# Altium integrated library CoLib.IntLib: 649 symbols (part 5 of 5)
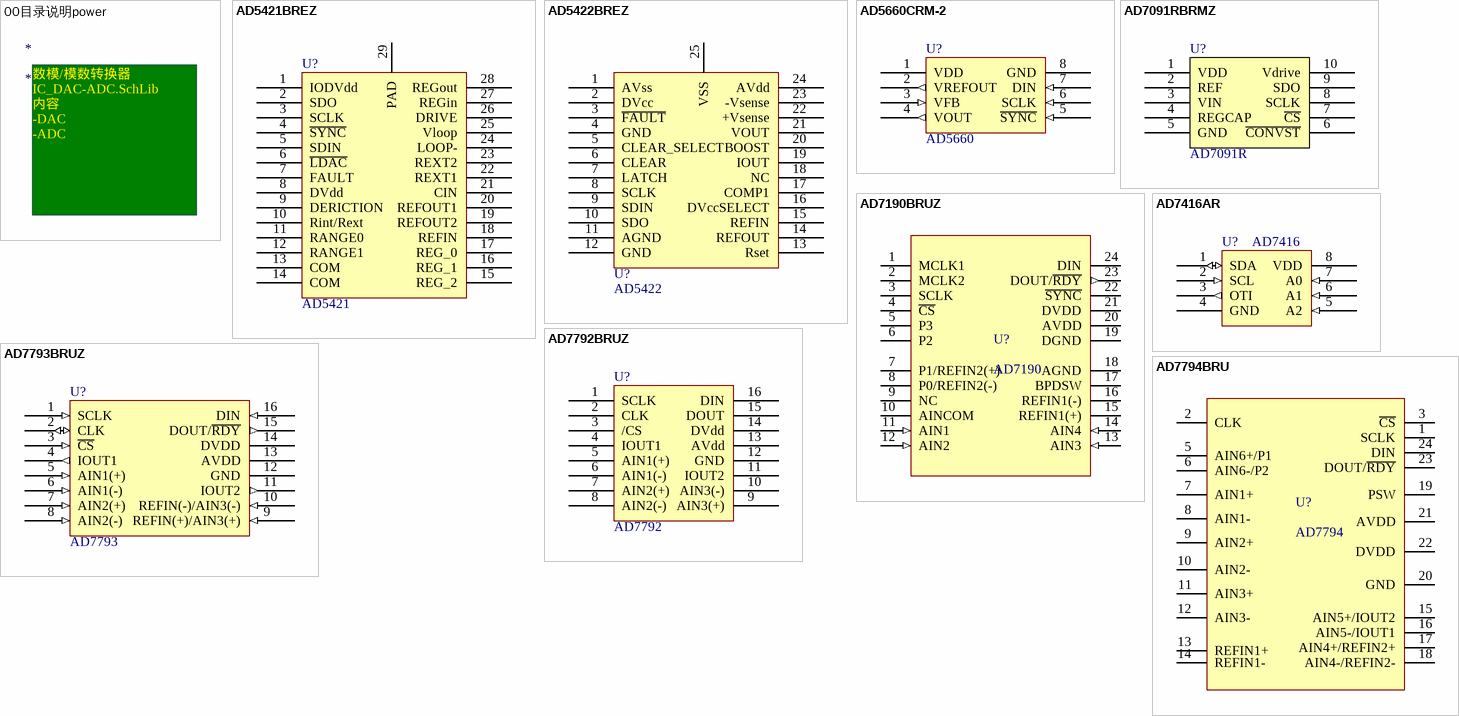
[diagram p43: symbols 00目录说明power to AD7794BRU]

## AD7794BRU
designator U?, comment AD7794
6-Channel, Low Noise, Low Power, 24 Bit Σ-Δ ADCwith On-Chip In-Amp and Reference; Manufacturer: ADI; Name: 模数转换器; Ordering No.: AD7794BRU
footprint TSSOP24/0.65_7.8*4.4 (TSSOP, 24-Leads, Body 7.9x4.5mm (max), Pitch 0.65mm, IPC Medium Density)
pins: 1 SCLK, 2 CLK, 3 ~{CS}, 5 AIN6+/P1, 6 AIN6-/P2, 7 AIN1+, 8 AIN1-, 9 AIN2+, 10 AIN2-, 11 AIN3+, 12 AIN3-, 13 REFIN1+, 14 REFIN1-, 15 AIN5+/IOUT2, 16 AIN5-/IOUT1, 17 AIN4+/REFIN2+, 18 AIN4-/REFIN2-, 19 PSW, 20 GND, 21 AVDD, 22 DVDD, 23 DOUT/~{RDY}, 24 DIN


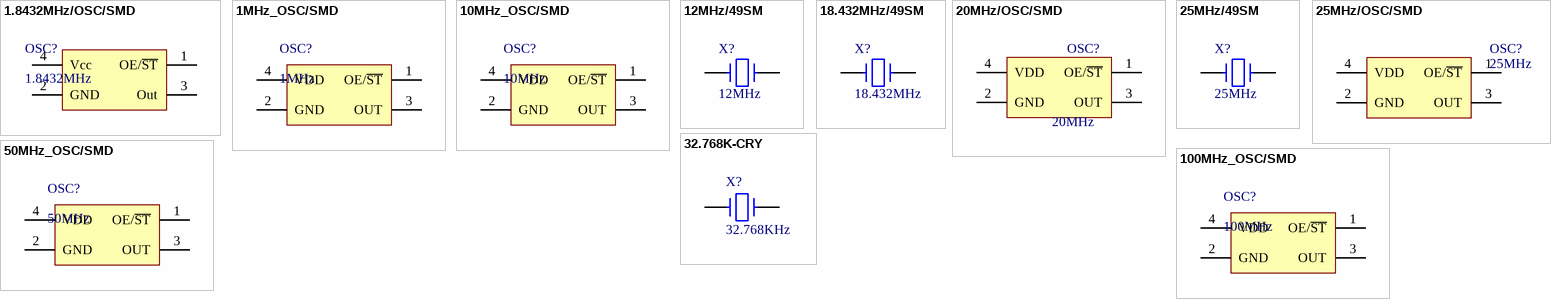
[diagram p35: symbols 1.8432MHz/OSC/SMD to 100MHz_OSC/SMD]

## 1.8432MHz/OSC/SMD
designator OSC?, comment 1.8432MHz
有源晶振,1.8432MHz, 30ppm,supply voltage:3.3V, dimension:7*5mm; Manufacturer: TAITIEN; Ordering No.: OCEMELKANF-1.843200; Name: 晶振; dimension: 7.0*5.0mm
footprint OSC7050 (晶振SMD 7.0x5.0mm)
pins: 1 OE/~{ST}, 2 GND, 3 Out, 4 Vcc

## 1MHz_OSC/SMD
designator OSC?, comment 1MHz
有源晶振,1MHz, 7x5mm; Manufacturer: Epson; 物料型号说明: 表贴7x5mm; Ordering NO.: SG8002CAPCB1MHZ; 物料替代型号: KDS,Citizen,SEIKO同型; Name: 晶振; 物料参考价格: 3.01
footprint OSC7050 (晶振SMD 7.0x5.0mm)
pins: 1 OE/~{ST}, 2 GND, 3 OUT, 4 VDD

## 10MHz_OSC/SMD
designator OSC?, comment 10MHz
有源晶振,10MHz, 7x5mm; Manufacturer: Epson; Ordering NO.: SG8002CAPCB10MHZ; 物料替代型号: KDS,Citizen,SEIKO同型; Name: 晶振
footprint OSC7050 (晶振SMD 7.0x5.0mm)
pins: 1 OE/~{ST}, 2 GND, 3 OUT, 4 VDD

## 12MHz/49SM
designator X?, comment 12MHz
通用石英晶体,12MHz,49SM; Manufacturer: KDS; 物料参考价格: 0.8; 物料型号说明: 49SM表贴晶体; Ordering NO.: 12MHz/49SM; Name: 晶体; 物料替代型号: n/a
footprint CRY13*4.8 (贴片晶振,13*4.8*4.3mm)
pins: 1, 2

## 18.432MHz/49SM
designator X?, comment 18.432MHz
通用石英晶体,18.432MHz,49SM; Manufacturer: TAITIEN; Name: 晶体; Ordering NO.: XJHEEL-18.432MHz
footprint CRY13*4.8 (贴片晶振,13*4.8*4.3mm)
pins: 1, 2

## 20MHz/OSC/SMD
designator OSC?, comment 20MHz
有源晶振,20MHz, 30ppm,supply voltage:3.3V, dimension:7*5mm; Manufacturer: TAITIEN; Ordering NO.: OCEMELJANF-20.000000; Name: 晶振
footprint OSC7050 (晶振SMD 7.0x5.0mm)
pins: 1 OE/~{ST}, 2 GND, 3 OUT, 4 VDD

## 25MHz/49SM
designator X?, comment 25MHz
通用石英晶体25MHz,49SM; Manufacturer: KDS; 物料参考价格: 0.8; 物料型号说明: 49SM表贴晶体; Ordering NO.: 25MHz/49SM; Name: 晶体; 物料替代型号: n/a
footprint CRY13*4.8 (贴片晶振,13*4.8*4.3mm)
pins: 1, 2

## 25MHz/OSC/SMD
designator OSC?, comment 25MHz
有源晶振,25MHz, 7x5mm; Name: 晶振; Price: 3.01; Ordering NO.: 25MHz
footprint OSC7050 (晶振SMD 7.0x5.0mm)
pins: 1 OE/~{ST}, 2 GND, 3 OUT, 4 VDD

## 32.768K-CRY
designator X?, comment 32.768KHz
晶体,32.768KHz,50ppm,12.5pF; Manufacturer: 泰艺; Name: 晶体; Ordering NO.: 32.768K
footprint CRY-32K (Footprint not found)
pins: 1, 2

## 50MHz_OSC/SMD
designator OSC?, comment 50MHz
有源晶振,50MHz, 7x5mm; Manufacturer: Epson; 物料型号说明: 表贴7x5mm; Ordering NO.: SG8002CAPCB50MHZ; 物料替代型号: KDS,Citizen,SEIKO同型; Name: 晶振; 物料参考价格: 3.01
footprint OSC7050 (晶振SMD 7.0x5.0mm)
pins: 1 OE/~{ST}, 2 GND, 3 OUT, 4 VDD

## 100MHz_OSC/SMD
designator OSC?, comment 100MHz
有源晶振,100MHz, 7x5mm; Manufacturer: Epson; 物料型号说明: 表贴7x5mm; Ordering NO.: SG8002CAPCB100MHZ; 物料替代型号: KDS,Citizen,SEIKO同型; Name: 晶振; 物料参考价格: 3.01
footprint OSC7050 (晶振SMD 7.0x5.0mm)
pins: 1 OE/~{ST}, 2 GND, 3 OUT, 4 VDD


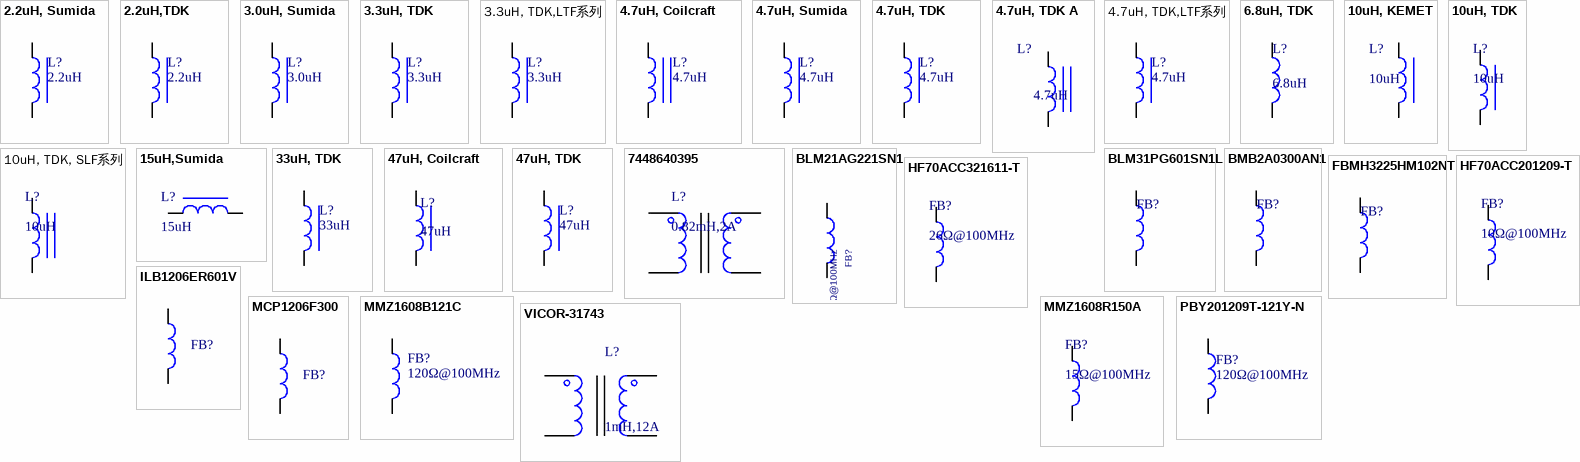
[diagram p36: symbols 2.2uH, Sumida to VICOR-31743]

## 2.2uH, Sumida
designator L?, comment 2.2uH
功率电感, 2.2uH, 31.3mΩ, 2.04A, 30%,5x5mm; Manufacturer: sumida; Ordering NO.: CDRH4D28NP-2R2NC; Name: 电感
footprint L5*5 (Footprint not found)
pins: 1, 2

## 2.2uH,TDK
designator L?, comment 2.2uH
功率电感, 2.2uH, 0.076Ω, 1.5A, 20%,3.5x3.7mm; Manufacturer: TDK; Ordering NO.: VLF4012AT-2R2M1R5; Name: 电感; Price: 1.5
footprint L3.5*3.7 (磁罐电感3.5*3.7mm厚1.2mm表贴电感)
pins: 1, 2

## 3.0uH, Sumida
designator L?, comment 3.0uH
功率电感, 3.0uH, 24mΩ, 2.4A, 30%,6x6mm(MAX); Manufacturer: sumida; Ordering NO.: CDRH5D28NP-3R0NC; Name: 电感
footprint L6*6 (Footprint not found)
pins: 1, 2

## 3.3uH, TDK
designator L?, comment 3.3uH
功率电感, 3.3uH, 0.1Ω, 1.3A, 20%,3.5x3.7mm; Manufacturer: TDK; Ordering NO.: VLF4012AT-3R3M1R3; Tips: 1A型%20,3.5x3.7mm; Name: 电感; Price: 1.5; 物料替代型号: n/a
footprint L3.5*3.7 (磁罐电感3.5*3.7mm厚1.2mm表贴电感)
pins: 1, 2

## 3.3uH, TDK,LTF系列
designator L?, comment 3.3uH
功率电感, 3.3uH, 0.1Ω, 1.3A, 20%,3.5x3.7mm; Manufacturer: TDK; Ordering NO.: LTF5022T-3R3N2R5-LC; Name: 电感
footprint L5.0*5.2 (Footprint not found)
pins: 1, 2

## 4.7uH, Coilcraft
designator L?, comment 4.7uH
功率电感, 4.7uH, 43mΩ, 方形罐装6.1 × 6.1 mm; Manufacturer: Coilcraft; Ordering NO.: MSS6132-472ML; Name: 电感
footprint L6.1*6.1 (Footprint not found)
pins: 1, 2

## 4.7uH, Sumida
designator L?, comment 4.7uH
功率电感, 4.7uH, 72mΩ, 1.32A, 30%,5x5mm; Manufacturer: sumida; Ordering NO.: CDRH4D28NP-4R7NC; Name: 电感
footprint L5*5 (Footprint not found)
pins: 1, 2

## 4.7uH, TDK
designator L?, comment 4.7uH
功率电感, 4.7uH, 0.14Ω, 1.1A, 3.5x3.7mm; Manufacturer: TDK; Ordering NO.: VLF4012AT-4R7M1R1; Tips: 1A型%20,3.5x3.7mm; Name: 电感; Price: 1.5; 物料替代型号: n/a
footprint L3.5*3.7 (磁罐电感3.5*3.7mm厚1.2mm表贴电感)
pins: 1, 2

## 4.7uH, TDK A
designator L?, comment 4.7uH
功率电感, 4.7uH, 方形罐装 7.1mm × 6.1 mm; Manufacturer: TDK; Ordering NO.: SPM6530T4R7M230; Name: 电感
footprint L 7.1*6.5
pins: 1, 2

## 4.7uH, TDK,LTF系列
designator L?, comment 4.7uH
功率电感, 4.7uH, 0.14Ω, 1.1A, 3.5x3.7mm; Manufacturer: TDK; Ordering NO.: LTF5022T-4R7N2R0-LC; Name: 电感
footprint L5.0*5.2 (Footprint not found)
pins: 1, 2

## 6.8uH, TDK
designator L?, comment 6.8uH
Manufacturer: muRata; Ordering NO.: LQM31PN4R7M00; Name: 电感
footprint L1206 (贴片磁珠1206, 120 x 60 mil)
pins: 1, 2

## 10uH, KEMET
designator L?, comment 10uH
片式电感, 10uH, ±20%, 1.2Ω, 0.24A, 0805; Manufacturer: KEMET; Ordering NO.: L0805C100MDWIT; Tips: 10uH电源用电感; Name: 电感
footprint L0805 (贴片电感或磁珠0805,80 x 50mil)
pins: 1, 2

## 10uH, TDK
designator L?, comment 10uH
功率电感, 10uH, 1.15Ω, 0.4A; Manufacturer: TDK; Ordering NO.: VLS201610ET-100M; Name: 电感
footprint L0806 (2mmX1.6mm)
pins: 1, 2

## 10uH, TDK, SLF系列
designator L?, comment 10uH
功率电感, 10uH, 0.0364Ω, 2.5A, 10.1mmx10.1mm; Manufacturer: TDK; Ordering NO.: SLF10145T-100M2R5-PF; Name: 电感
footprint L10.1*10.1 (10.1mmX10.1mm)
pins: 1, 2

## 15uH,Sumida
designator L?, comment 15uH
功率电感, 15uH,  41mΩ, 3.4A, 方形罐装, 10.3mm × 10.5mm; Manufacturer: Sumida; Ordering NO.: CDRH105R-150; Name: 电感
footprint L10.3*10.5 (sumida公司功率电感封装)
pins: 1, 2

## 33uH, TDK
designator L?, comment 33uH
功率电感, 33uH, 1.2Ω, 0.44A, 3.5x3.7mm; Manufacturer: TDK; Ordering NO.: VLF4012AT-330MR39; Tips: 1A型%20,3.5x3.7mm; Name: 电感; Price: 1.5; 物料替代型号: n/a
footprint L3.5*3.7 (磁罐电感3.5*3.7mm厚1.2mm表贴电感)
pins: 1, 2

## 47uH, Coilcraft
designator L?, comment 47uH
功率电感, 47uH, 0.1Ω, 1.85A, 方形罐装; Manufacturer: Coilcraft; Ordering NO.: MMS1206-473MXD/B; Name: 电感; Price: 0.21
footprint L0805 (贴片电感或磁珠0805,80 x 50mil)
pins: 1, 2

## 47uH, TDK
designator L?, comment 47uH
功率电感, 47uH, 0.2Ω, 0.36A, 3.5x3.7mm; Manufacturer: TDK; Ordering NO.: VLF4012AT-470MR30; Tips: 1A型%20,3.5x3.7mm; Name: 电感; Price: 1.5; 物料替代型号: n/a
footprint L3.5*3.7 (磁罐电感3.5*3.7mm厚1.2mm表贴电感)
pins: 1, 2

## 7448640395
designator L?, comment 0.82mH,2A
共模电感,0.82mH,2A,Current Compensated Choke; Manufacturer: WE; Ordering No.: 7448640395; Name: 共模电感
footprint INDC-13
pins: 1, 2, 3, 4

## BLM21AG221SN1
designator FB?, comment 220Ω@100MHz
磁珠,IND - SMD EMI Filters/Chip Ferrite Bead, 220Ω(Impedance) @ 100MHz, 0.35Ω (DC Resistance),0805; Manufacturer: Murata; Ordering NO.: BLM21AG221SN1; Item Num: P04-16225R; RoHS Compliant: Yes; Price: 0; Name: 磁珠
footprint L0805 (贴片电感或磁珠0805,80 x 50mil)
pins: 1, 2

## BLM31PG601SN1L
designator FB?, comment 600Ω@100MHz  (value not drawn)
高电流片式电源线磁珠, 600Ω(Impedance)@100MHz,  0.09Ω(DC Resistance), 1.5A, 1206; Manufacturer: Murata; Ordering NO.: BLM31PG601SN1L; Name: 磁珠
footprint L1206 (贴片电感或磁珠1206, 120 x 60 mil)
pins: 1, 2

## BMB2A0300AN1
designator FB?, comment 300Ω@100MHz  (value not drawn)
磁珠, 300Ω(Impedance)@100MHz,  0.5Ω(DC Resistance), 250mA, 0805; Manufacturer: TE; Ordering NO.: BMB2A0300AN1; Tips: 配合AD5422使用; Name: 磁珠
footprint L0805 (贴片电感或磁珠0805,80 x 50mil)
pins: 1, 2

## FBMH3225HM102NT
designator FB?, comment 1000Ω@100MHz  (value not drawn)
高电流片式电源线磁珠, 1000Ω(Impedance)@100MHz,  0.1Ω(DC Resistance), 2A, 1210; Manufacturer: Taiyo Yuden; Ordering NO.: FBMH3225HM102NT; Tips: 配合AD5422使用; Name: 磁珠
footprint L1210 (Footprint not found)
pins: 1, 2

## HF70ACC201209-T
designator FB?, comment 10Ω@100MHz
磁珠, 10Ω(Impedance)@100MHz, 0.03Ω(DC resistance),1.5A, 0805; Manufacturer: TDK; 物料替代型号: HF50ACC201209; Ordering NO.: HF70ACC201209-T; Tips: 电源型26R@100MHz,40mR,1.5A,2000/卷; Price: 0.80; Name: 磁珠
footprint L0805 (贴片电感或磁珠0805,80 x 50mil)
pins: 1, 2

## HF70ACC321611-T
designator FB?, comment 26Ω@100MHz
磁珠, 26Ω(Impedance)@100MHz, 0.04Ω(DC resistance),1.5A, 1206; Manufacturer: TDK; Ordering NO.: HF70ACC321611-T; Tips: 电源型26R@100MHz,40mR,1.5A,; Price: 0.80; 物料替代型号: n/a; Name: 磁珠
footprint L1206 (贴片磁珠1206, 120 x 60 mil)
pins: 1, 2

## ILB1206ER601V
designator FB?, comment 600Ω@100MHz  (value not drawn)
磁珠, 600Ω(Impedance)@100MHz,1206; Manufacturer: VISHAY; Ordering NO.: ILB1206ER601V; Name: 磁珠
footprint L1206 (贴片磁珠1206, 120 x 60 mil)
pins: 1, 2

## MCP1206F300
designator FB?, comment 30Ω@100MHz  (value not drawn)
磁珠, 30Ω(Impedance)@100MHz, 0.02Ω(DC resistance), 4A, 1206; Manufacturer: AEM; Ordering NO.: MCP1206F300; Name: 磁珠
footprint L1206 (Footprint not found)
pins: 1, 2

## MMZ1608B121C
designator FB?, comment 120Ω@100MHz
磁珠, 120Ω(Impedance)@100MHz,0.15Ω(DC resistance), 0.6A,0603; Manufacturer: TDK; Ordering NO.: MMZ1608B121C; Price: 0.21; Name: 磁珠
footprint L0603 (贴边电感0603或磁珠,60 x 30 mil)
pins: 1, 2

## MMZ1608R150A
designator FB?, comment 15Ω@100MHz
磁珠, 15Ω(Impedance)@100MHz, 0.05Ω(DC resistance),1.5A, 0603; Manufacturer: TDK; 物料替代型号: MMZ1608R300A/0603; Ordering NO.: MMZ1608R150A; Tips: 电源型15R@100MHz,50mR,1.5A,2000/卷; Price: 0.80; Name: 磁珠
footprint L0603 (贴边电感0603或磁珠,60 x 30 mil)
pins: 1, 2

## PBY201209T-121Y-N
designator FB?, comment 120Ω@100MHz
磁珠, 120Ω(Impedance)@100MHz, 0.04Ω(DC resistance), 3A, 0805; Manufacturer: YAGEO CORPORATION; Ordering NO.: PBY201209T-121Y-N; Name: 磁珠
footprint L0805
pins: 1, 2

## VICOR-31743
designator L?, comment 1mH,12A
共模电感 1mH 12A; Manufacturer: VICOR; Ordering NO.: VICOR-31743; Name: 共模电感
footprint INDC-15
pins: 1, 2, 3, 4


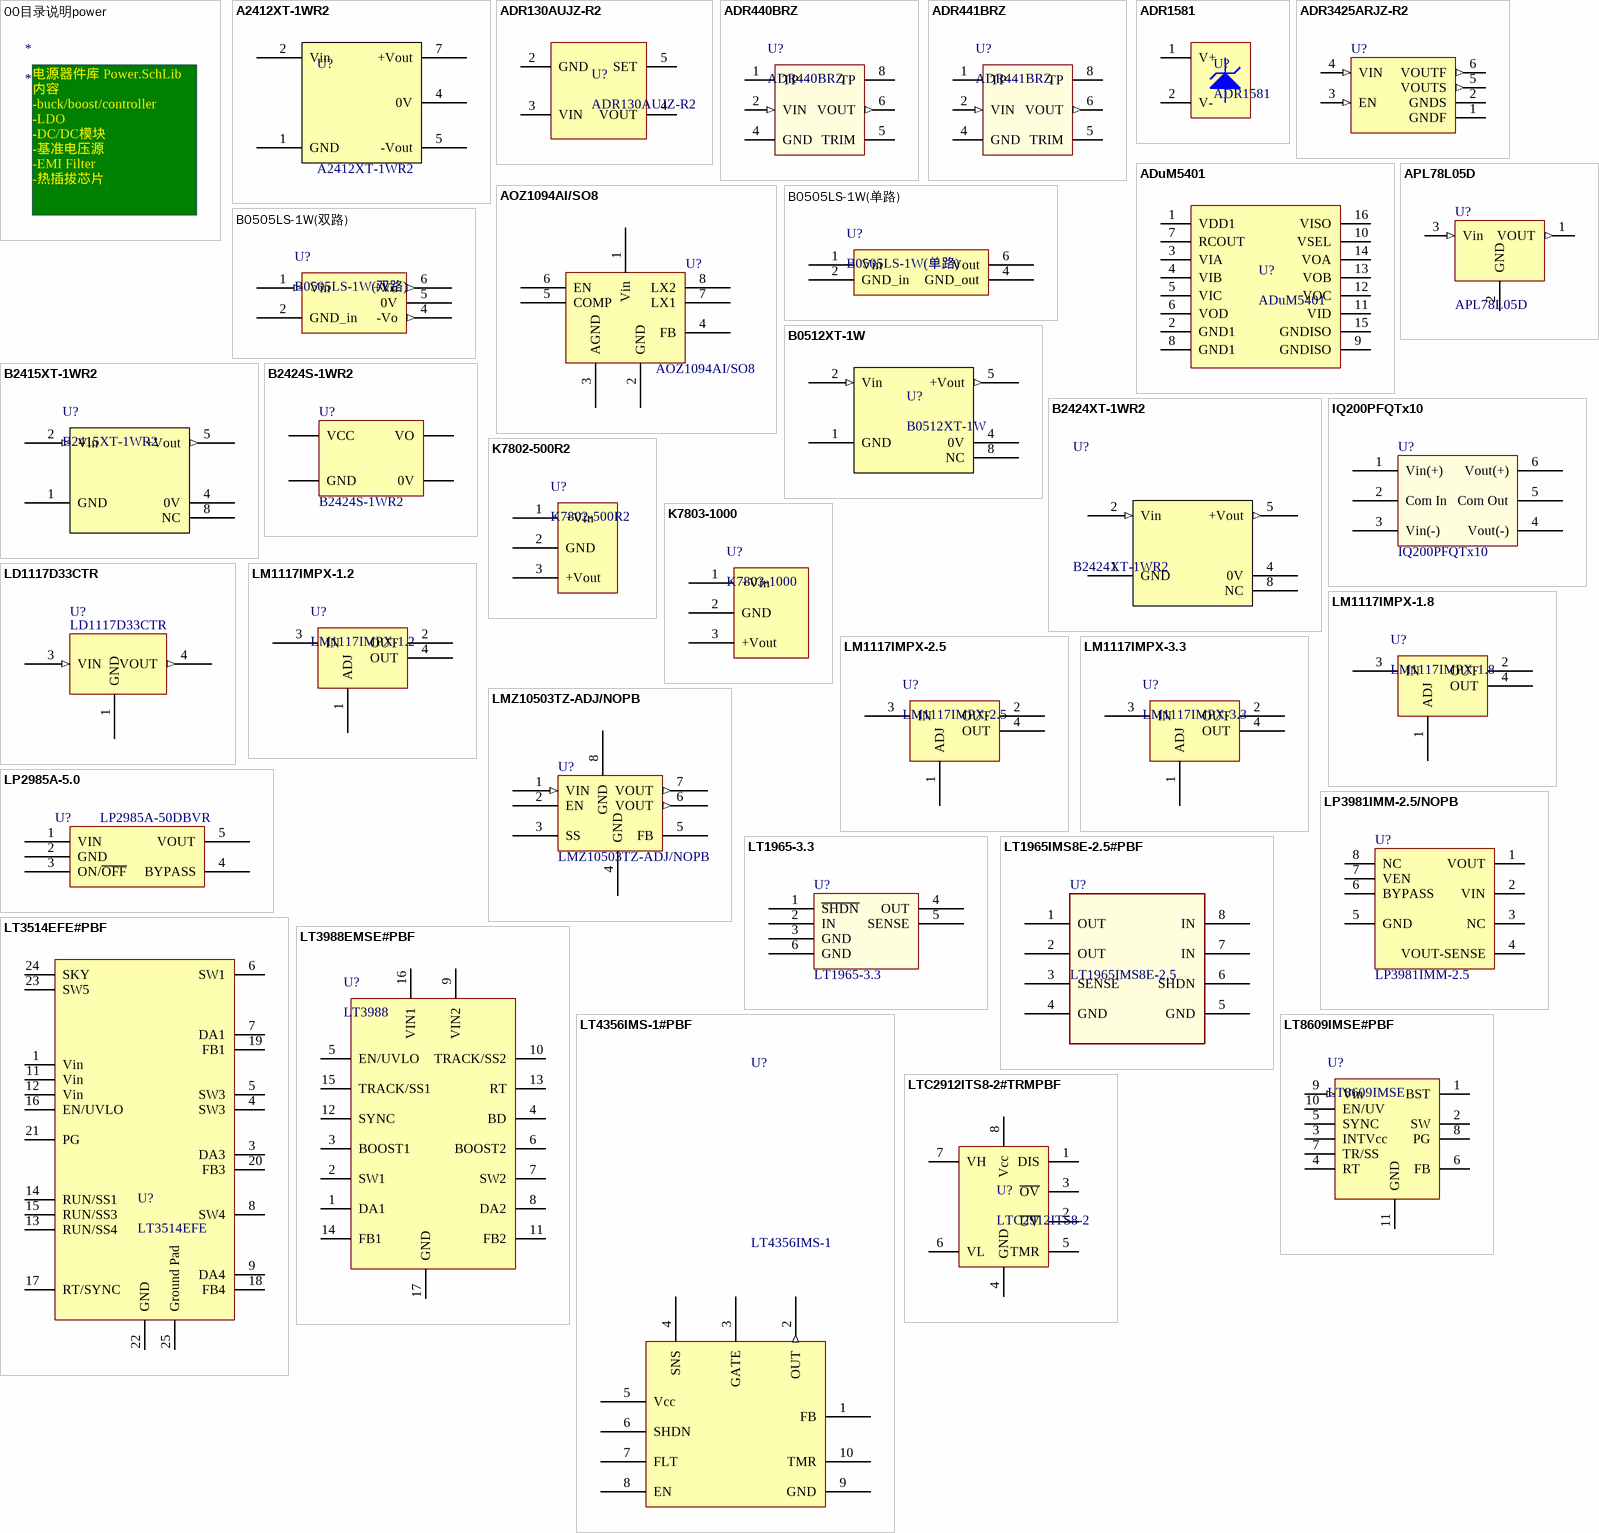
[diagram p37: symbols 00目录说明power to LTC2912ITS8-2#TRMPBF]

## 00目录说明power
designator *
text: 电源器件库 Power.SchLib / 内容 / -buck/boost/controller / -LDO / -DC/DC模块 / -基准电压源 / -EMI Filter / -热插拔芯片 /

## A2412XT-1WR2
designator U?
24V-12VDC/DC, Isolated, UNregulated, 1W; Manufacturer: MORNSUN; Name: DC/DC电源模块; Ordering NO.: A2412XT-1WR2
footprint SPM6/2.54
pins: 1 GND, 2 Vin, 4 0V, 5 -Vout, 7 +Vout

## ADR130AUJZ-R2
designator U?
Precision Series Sub-Band Gap Voltage Reference; Manufacturer: ADI; Name: 基准电压源; Note: 当SET引脚接VOUT引脚时，输出0.5V。当SET引脚接GND引脚时，输出1V; Ordering No.: ADR130AUJZ-R2
footprint SOT23-6 (SOT-23/SC-74A; 5 Leads; Body 3.1 x 3 mm, inc. leads (LxW max))
pins: 2 GND, 3 VIN, 4 VOUT, 5 SET

## ADR440BRZ
designator U?
超低噪声LDO XFET 基准电压源，具有吸电流和源电流能力; Manufacturer: ADI; Name: 基准电压源; Tips: 要求输出电压为2.048V~5V的都可以选择44X系列; Ordering NO.: ADR440BRZ
footprint SO8/1.27_4.9*3.9 (SOIC, 8-Leads, Body 4.9x3.9mm, Pitch 1.27mm,)
pins: 1 TP, 2 VIN (in), 4 GND (power), 5 TRIM, 6 VOUT (out), 8 TP

## ADR441BRZ
designator U?
Ultralow Noise,LDO XFET Voltage Reference with Current Sink and Source; Manufacturer: ADI; Name: 基准电压源; Ordering NO.: ADR441BRZ
footprint SO8/1.27_4.9*3.9 (SOIC, 8-Leads, Body 4.9x3.9mm, Pitch 1.27mm,)
pins: 1 TP, 2 VIN (in), 4 GND (power), 5 TRIM, 6 VOUT (out), 8 TP

## ADR1581
designator U?
1.25V Micropower,Precision Shunt Volatge Refence; Manufacturer: ADI; Name: 基准电压源; Ordering NO.: ADR1581ARTZ-R2; Initial Output Error: 10mV; Temperature Coefficient: 100ppm/℃
footprint SOT23-3 (SOT23, 3-Leads, Body 2.92x1.3mm, Pitch 0.95mm, Lead Span 2.3mm, IPC Medium Density)
pins: 1 V+, 2 V-

## ADR3425ARJZ-R2
designator U?  (value not drawn)
Micropower,High Accuracy Voltage References,Output Voltalge 2.5V; Manufacturer: ADI; Name: 基准电压源; Ordering NO.: ADR3425ARJZ-R2
footprint SOT23-6
pins: 1 GNDF (power), 2 GNDS (power), 3 EN (in), 4 VIN (in), 5 VOUTS (out), 6 VOUTF (out)

## ADuM5401
designator U?
Quad-Channel,2.5KV Isolators with Integrated DC to DC Converter; Manufacturer: ADI; Name: DC/DC电源模块; Ordering No.: ADuM5401ARWZ
footprint SO16/1.27_10.3*7.5 (SOIC_W,16-Pin Wide Body Small Outline Integrated Circuit 1.27 mm Pitch, IPC Medium Density)
pins: 1 VDD1, 2 GND1, 3 VIA, 4 VIB, 5 VIC, 6 VOD, 7 RCOUT, 8 GND1, 9 GNDISO, 10 VSEL, 11 VID, 12 VOC, 13 VOB, 14 VOA, 15 GNDISO, 16 VISO

## AOZ1094AI/SO8
designator U?
DC/DC控制器3.00rmb/1pcs; Manufacturer: AOZ; 物料型号说明: SO8工业级; Name: DC/DC控制器BUCK; Price_Date: 2011-07; Ordering NO.: AOZ1094AI; Price: 2.5
footprint SO8/1.27_4.9*3.9 (SOIC, 8-Leads, Body 4.9x3.9mm, Pitch 1.27mm,)
pins: 1 Vin, 2 GND, 3 AGND, 4 FB, 5 COMP, 6 EN, 7 LX1, 8 LX2

## APL78L05D
designator U?
Three-Terminal Low Current Positive Voltage Regulator, Max Input Voltage:30V, Output Voltage:5V, 100mA; Manufacturer: ANPEC; Name: LDO; Ordering NO.: APL78L05D
footprint SOT89-3 (SOT89(TO-243AA*), 3-Leads, Body 4.5x2.5mm (max), Pitch 1.60mm, Lead Span 4.1mm, IPC Medium Density)
pins: 1 VOUT (out), 2 GND (power), 3 Vin (in)

## B0505LS-1W(单路)
designator U?
隔离DC/DC厚膜IC模块定,1W,定电压输入，隔离非稳压单路输出; Manufacturer: 金升阳; Name: DC/DC电源模块; Price: 8; Ordering NO.: B0505LS-1W
footprint SIP6-4/2.54 (DC隔离模块)
pins: 1 Vin, 2 GND_in, 4 GND_out, 6 Vout

## B0505LS-1W(双路)
designator U?
隔离DC/DC厚膜IC模块定,1W,定电压输入，隔离非稳压正负双路输出; Manufacturer: 金升阳; Name: DC/DC电源模块; Price: 8; Ordering NO.: B0505LS-1W
footprint SIP6-5/2.54 (DC隔离模块，正负双路)
pins: 1 Vin (in), 2 GND_in (power), 4 -Vo (out), 5 0V (power), 6 +Vo (out)

## B0512XT-1W
designator U?
1W,FIXED INPUT:5V, ISOLATED & UNREGULATED  SINGLE OUTPUT:12V, SMD DC-DC CONVERTER; Manufacturer: 金升阳; Name: 升压模块; Ordering NO.: B0512XT-1W
footprint SPM5/2.54
pins: 1 GND (power), 2 Vin (in), 4 0V (power), 5 +Vout (out), 8 NC

## B2415XT-1WR2
designator U?
1W,Fixed input:24V,Isolated&Unregulated single output:15V; Manufacturer: 金升阳; Name: DC-DC电源模块; Ordering NO.: B2415XT-1WR2
footprint SPM5/2.54
pins: 1 GND (power), 2 Vin (in), 4 0V (power), 5 +Vout (out), 8 NC

## B2424S-1WR2
designator U?
1W，小型定电压输入，1500VDC 隔离非稳压  单输出系列DC-DC(24V-24V) 模块电源; Manufacturer: 金升阳; Name: DC/DC电源模块; Ordering NO.: B2424S-1WR2
footprint SIP4/2.54-A
pins: 1 GND, 2 VCC, 3 0V, 4 VO

## B2424XT-1WR2
designator U?
1W, FIXED INPUT:24V, ISOLATED & UNREGULATED  SINGLE OUTPUT:24V; Manufacturer: 金升阳; Name: DC/DC电源模块; Ordering NO.: B2424XT-1WR2
footprint SPM5/2.54
pins: 1 GND (power), 2 Vin (in), 4 0V (power), 5 +Vout (out), 8 NC

## IQ200PFQTx10
designator U?
EMI Filter,-200 to +200V Input,10A Output Current,70mΩ@100℃ Max DC Resistance,>80dB@250kHz Differential Attenuation; Manufacturer: SynQor; Name: EMI Filter; Ordering NO.: IQ200PFQTx10
footprint FLT6_61*39
pins: 1 Vin(+), 2 Com In, 3 Vin(-), 4 Vout(-), 5 Com Out, 6 Vout(+)

## K7802-500R2
designator U?
非隔离稳压DC/DC,24VDC转3.3VDC; Manufacturer: 金升阳; Name: DC/DC(非隔离型); Ordering NO.: K7802-500R2
footprint SIP3/2.54-A (11.6*7.55*10.16mm)
pins: 1 +Vin, 2 GND, 3 +Vout

## K7803-1000
designator U?
非隔离稳压DC/DC,24VDC转3.3VDC; Manufacturer: 金升阳; Name: DC/DC(非隔离型); Ordering NO.: K7803-1000
footprint SIP3/2.54-B
pins: 1 +Vin, 2 GND, 3 +Vout

## LD1117D33CTR
designator U?
Adjustable and Fixed Low Drop Positive Voltage Regulator; Manufacturer: ST; Ordering NO.: LD1117DT33CTR; Name: LDO
footprint TO-252AA
pins: 1 GND (power), 3 VIN (in), 4 VOUT (out)

## LM1117IMPX-1.2
designator U?
LDO,800mA; Manufacturer: NS; 物料说明: LDO,1.8V; 物料型号说明: 贴片LDO 1.8V; 物料替代型号: 国产同型,SP1117-1.8; Price: 0.01; 物料供应商: NS; Ordering NO.: LM1117IMPX-1.2; Name: LDO
footprint SOT223-4 (SOT-223/SC-73; 4 Leads; Body 6.7 x 7.3 mm, inc. leads (LxW max))
pins: 1 ADJ, 2 OUT, 3 IN, 4 OUT

## LM1117IMPX-1.8
designator U?
LDO,800mA; Manufacturer: NS; 物料说明: LDO,1.8V; 物料型号说明: 贴片LDO 1.8V; 物料替代型号: 国产同型,SP1117-1.8; Price: 0.01; 物料供应商: NS; Ordering NO.: LM1117IMPX-1.8; Name: LDO
footprint SOT223-4 (SOT-223/SC-73; 4 Leads; Body 6.7 x 7.3 mm, inc. leads (LxW max))
pins: 1 ADJ, 2 OUT, 3 IN, 4 OUT

## LM1117IMPX-2.5
designator U?
LDO,800mA; Manufacturer: NS; 物料说明: LDO,2.5V; 物料型号说明: 贴片LDO 2.5V; 物料替代型号: 国产同型,SP1117-2.5; Price: 0.01; 物料供应商: NS; Ordering NO.: LM1117IMPX-2.5; Name: LDO
footprint SOT223-4 (SOT-223/SC-73; 4 Leads; Body 6.7 x 7.3 mm, inc. leads (LxW max))
pins: 1 ADJ, 2 OUT, 3 IN, 4 OUT

## LM1117IMPX-3.3
designator U?
LDO,800mA; Manufacturer: NS; 物料说明: LDO,3.3V; 物料型号说明: 贴片LDO 3.3V; 物料替代型号: 国产同型,SP1117-3.3; Price: 0.01; 物料供应商: NS; Name: LDO; Ordering NO.: LM1117IMPX-3.3
footprint SOT223-4 (SOT-223/SC-73; 4 Leads; Body 6.7 x 7.3 mm, inc. leads (LxW max))
pins: 1 ADJ, 2 OUT, 3 IN, 4 OUT

## LMZ10503TZ-ADJ/NOPB
designator U?
LMZ10503 3A SIMPLE SWITCHER? Power Module with 5.5V Maximum Input Voltage; Manufacturer: TI; Name: DC/DC电源模块; Ordering NO.: LMZ10503TZ-ADJ/NOPB
footprint PFM7/1.27 (7-Lead)
pins: 1 VIN (in), 2 EN, 3 SS, 4 GND (power), 5 FB, 6 VOUT (out), 7 VOUT (out), 8 GND (power)

## LP2985A-5.0
designator U?, comment LP2985A-50DBVR
LDO稳压器 5V, 150mA low noise ,low dropout regulator with shutdown; Manufacturer: TI; Name: LDO; Ordering NO.: LP2985A-50DBVR
footprint SOT23-5 (SOT-23/SC-74A; 5 Leads; Body 3 x 3 mm, inc. leads (LxW max))
pins: 1 VIN, 2 GND, 3 ON/~{OFF}, 4 BYPASS, 5 VOUT

## LP3981IMM-2.5/NOPB
designator U?, comment LP3981IMM-2.5
300mA Ultra Low-Dropout CMOS Voltage Regulator; Manufacturer: TI; Ordering NO.: LP3981IMM-2.5/NOPB; Name: LDO
footprint MSOP8/0.65_3*3 (MSOP,8 PIN,Pitch 0.65mm,Body 3mmX3mm)
pins: 1 VOUT, 2 VIN, 3 NC, 4 VOUT-SENSE, 5 GND, 6 BYPASS, 7 VEN, 8 NC

## LT1965-3.3
designator U?
5-3.3V LDO电源模块, 1.1A, Low Noise,  Low Dropout Linear Regulator; Name: LDO; Manufacturer: Linear; Ordering NO.: LT1965-3.3
footprint DD-PAK-5
pins: 1 ~{SHDN}, 2 IN, 3 GND, 4 OUT, 5 SENSE, 6 GND

## LT1965IMS8E-2.5#PBF
designator U?, comment LT1965IMS8E-2.5
输出2.5V LDO电源模块, 1.1A, Low Noise,  Low Dropout Linear Regulator; Name: LDO; Ordering NO.: LT1965IMS8E-2.5#PBF; Manufacturer: Linear
footprint MSOP8/0.65_3*3 (MSOP,8 PIN,Pitch 0.65mm,Body 3mmX3mm)
pins: 1 OUT, 2 OUT, 3 SENSE, 4 GND, 5 GND, 6 SHDN, 7 IN, 8 IN

## LT3514EFE#PBF
designator U?, comment LT3514EFE
Triple Step-Down Switching  Regulator with 100%  Duty Cycle Operation; Manufacturer: Linear; Name: DC/DC(非隔离型); Ordering NO.: LT3514EFE#PBF
footprint TSSOP24/0.65_7.8*4.4-T
pins: 1 Vin, 3 DA3, 4 SW3, 5 SW3, 6 SW1, 7 DA1, 8 SW4, 9 DA4, 11 Vin, 12 Vin, 13 RUN/SS4, 14 RUN/SS1, 15 RUN/SS3, 16 EN/UVLO, 17 RT/SYNC, 18 FB4, 19 FB1, 20 FB3, 21 PG, 22 GND, 23 SW5, 24 SKY, 25 Ground Pad

## LT3988EMSE#PBF
designator U?, comment LT3988
Dual 60V Monolithic 1A  Step-Down Switching  Regulator; Manufacturer: Linear; NAME: DC/DC(非隔离型); Ordering NO.: LT3988EMSE#PBF
footprint MSOP16/0.5_4*3-T (MSOP, 16-Leads,  Exposed Die Pad,Body 4.1x3.1mm (max), Pitch 0.50mm, IPC Medium Density)
pins: 1 DA1, 2 SW1, 3 BOOST1, 4 BD, 5 EN/UVLO, 6 BOOST2, 7 SW2, 8 DA2, 9 VIN2, 10 TRACK/SS2, 11 FB2, 12 SYNC, 13 RT, 14 FB1, 15 TRACK/SS1, 16 VIN1, 17 GND

## LT4356IMS-1#PBF
designator U?, comment LT4356IMS-1
热插拔芯片4v to 80V Overvoltage Protection  Regulator and Inrush Limiter; Manufacturer: Linear; Ordering NO.: LT4356IMS-1#PBF; Name: 热插拔芯片
footprint MSOP10/0.5_3*3 (MSOP,8 PIN,Pitch 0.65mm,Body 4mmX3mm)
pins: 1 FB, 2 OUT (out), 3 GATE, 4 SNS, 5 Vcc (power), 6 SHDN, 7 FLT, 8 EN, 9 GND (power), 10 TMR

## LT8609IMSE#PBF
designator U?, comment LT8609IMSE
42V, 2A Synchronous  Step-Down Regulator with  2.5μA Quiescent Current; Manufacturer: Linear; Ordering NO.: LT8609IMSE#PBF; Name: DC/DC(非隔离型)
footprint MSOP10/0.5_3*3 -T (MSOP,10 PIN,Pitch 0.5mm,Body 3mmX3mm)
pins: 1 BST, 2 SW, 3 INTVcc, 4 RT, 5 SYNC, 6 FB, 7 TR/SS, 8 PG, 9 Vin (in), 10 EN/UV, 11 GND (power)

## LTC2912ITS8-2#TRMPBF
designator U?, comment LTC2912ITS8-2
Single UV/OV  Voltage Monitor; Manufacturer: Linear; Name: 电源监视芯片; Ordering NO.: LTC2912ITS8-2#TRMPBF
footprint SOT23-8 (TSOT-23/SOT-23; 8Leads; Body 1.625 x 2.9mm)
pins: 1 DIS (power), 2 ~{UV}, 3 ~{OV}, 4 GND (power), 5 TMR, 6 VL, 7 VH, 8 Vcc (power)

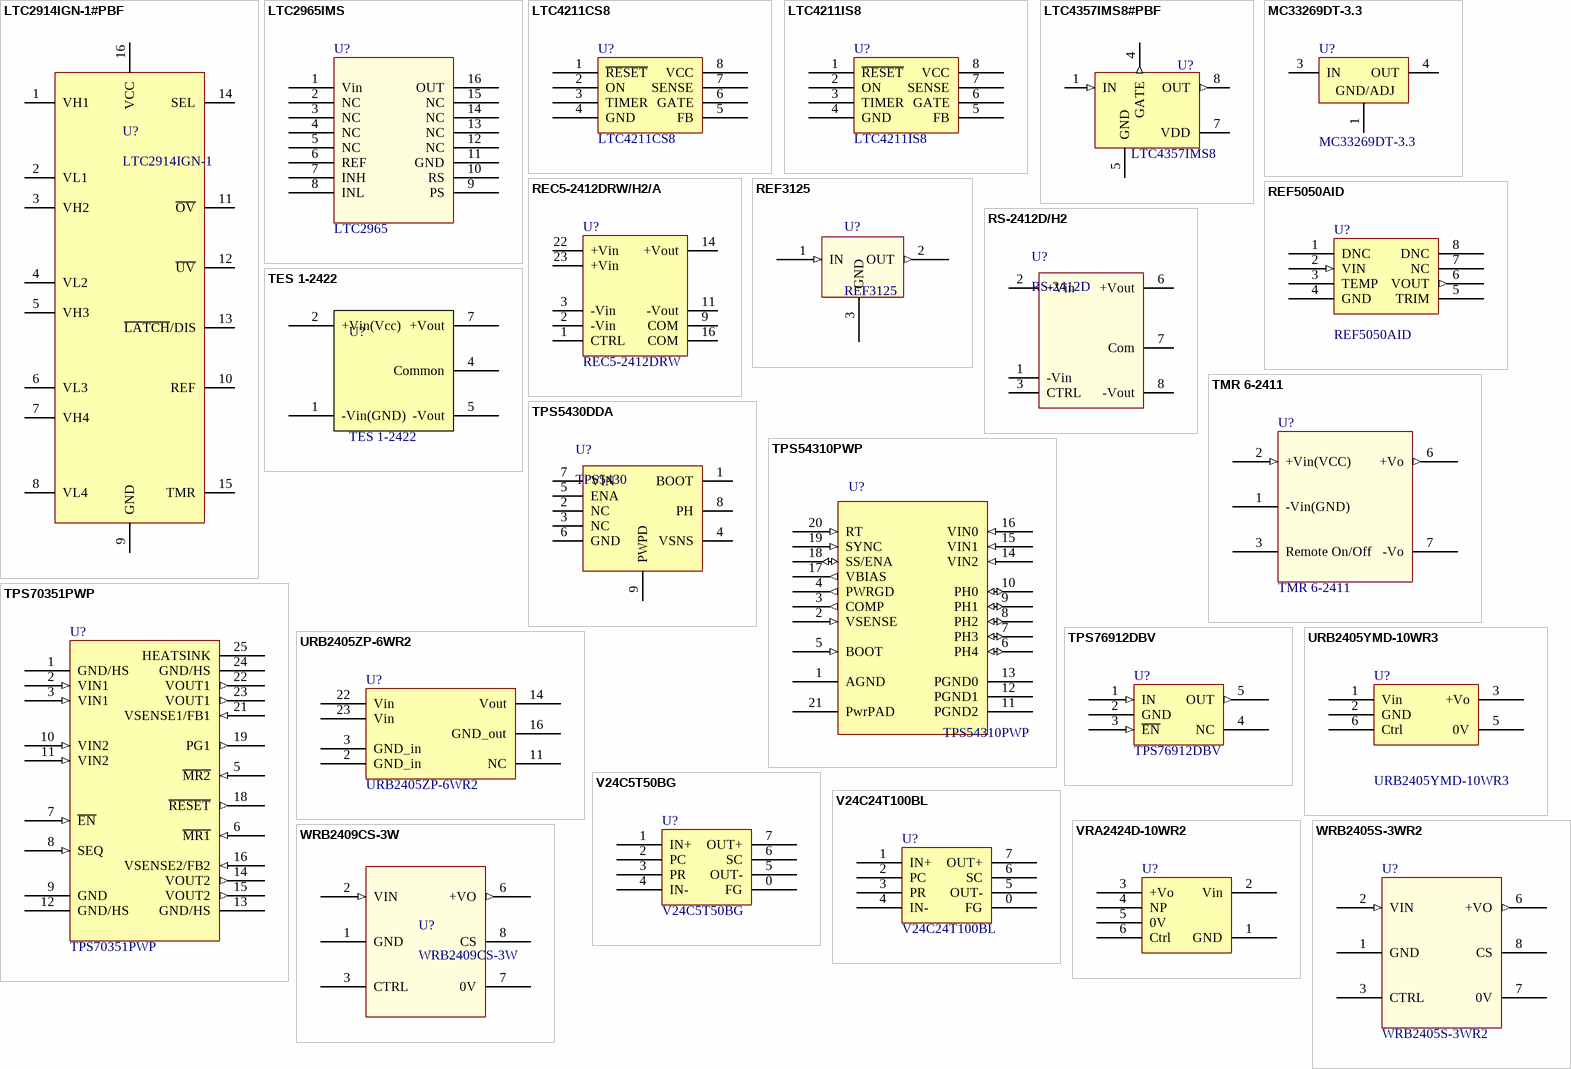
[diagram p38: symbols LTC2914IGN-1#PBF to WRB2409CS-3W]

## LTC2914IGN-1#PBF
designator U?, comment LTC2914IGN-1
Quad UV/OV Positive/Negative Voltage Monitor; Manufacturer: Linear; Name: 电源监视芯片; Ordering NO.: LTC2914IGN-1#PBF
footprint SSOP16/0.635_4.9*3.9 (SSOP; 16 Leads; Body Width 3.9 mm; Pitch 0.635 mm)
pins: 1 VH1, 2 VL1, 3 VH2, 4 VL2, 5 VH3, 6 VL3, 7 VH4, 8 VL4, 9 GND (power), 10 REF, 11 ~{OV}, 12 ~{UV}, 13 ~{LATCH}/DIS, 14 SEL, 15 TMR, 16 VCC (power)

## LTC2965IMS
designator U?, comment LTC2965
100V Micropower Single Voltage Monitor; Manufacturer: Linear; Name: 电源监视芯片; Ordering No.: LTC2965IMS
footprint MSOP16/0.5_4*3 (TSSOP, 16-Leads, Body 4.1x3.1mm (max), Pitch 0.50mm, IPC Medium Density)
pins: 1 Vin, 2 NC, 3 NC, 4 NC, 5 NC, 6 REF, 7 INH, 8 INL, 9 PS, 10 RS, 11 GND, 12 NC, 13 NC, 14 NC, 15 NC, 16 OUT

## LTC4211CS8
designator U?
热插拔控制芯片2.5~16.5v; Manufacturer: Linear; Name: 热插拔芯片; 物料替代型号: LTC4211iS8; 物料型号说明: SO8封装商业及; Price: 35; Ordering NO.: LTC4211CS8
footprint SO8/1.27_4.9*3.9 (SOIC, 8-Leads, Body 4.9x3.9mm, Pitch 1.27mm,)
pins: 1 ~{RESET}, 2 ON, 3 TIMER, 4 GND, 5 FB, 6 GATE, 7 SENSE, 8 VCC

## LTC4211IS8
designator U?
Hot Swap Controller with Multifunction Current Control; Manufacturer: Linear; Name: 热插拔芯片; Ordering NO.: LTC4211IS8
footprint SO8/1.27_4.9*3.9 (SOIC, 8-Leads, Body 4.9x3.9mm, Pitch 1.27mm,)
pins: 1 ~{RESET}, 2 ON, 3 TIMER, 4 GND (power), 5 FB, 6 GATE, 7 SENSE, 8 VCC (power)

## LTC4357IMS8#PBF
designator U?, comment LTC4357IMS8
Positive High Voltage Ideal Diode Controller; Manufacturer: Linear; Ordering NO.: LTC4357IMS8#PBF; Name: 电源管理芯片
footprint MSOP8/0.65_3*3 (MSOP,8 PIN,Pitch 0.65mm,Body 3mmX3mm)
pins: 1 IN (in), 2 NC hidden, 3 NC hidden, 4 GATE (out), 5 GND (power), 6 NC hidden, 7 VDD (power), 8 OUT (out)

## MC33269DT-3.3
designator U?
Low Dropout Positive Fixed Voltage Regulator; Manufacturer: ON; Name: LDO; Ordering NO.: MC33269DT-3.3
footprint SOT223-4 (Footprint not found)
pins: 1 GND/ADJ (power), 3 IN (power), 4 OUT (power)

## REC5-2412DRW/H2/A
designator U?, comment REC5-2412DRW
24V输入，± 12V输出，5W功率，2kV隔离; Manufacturer: RECOM; Ordering NO.: REC5-2412DRW/H2/A; Name: DC/DC电源模块; Price: 150RMB
footprint DIP24-9/2.54
pins: 1 CTRL, 2 -Vin, 3 -Vin, 9 COM, 11 -Vout, 14 +Vout, 16 COM, 22 +Vin, 23 +Vin

## REF3125
designator U?
15ppm/°C Max, 100μA, SOT23-3  SERIES VOLTAGE REFERENCE:2.5V; Manufacturer: BB; Name: 基准电压源; Ordering NO.: REF3125
footprint SOT23-3 (SOT23, 3-Leads, Body 2.9x1.3mm, Pitch 0.95mm, Lead Span 2.3mm, IPC Medium Density)
pins: 1 IN (in), 2 OUT (out), 3 GND (power)

## REF5050AID
designator U?
Low-Noise, Very Low Drift:3ppm, Precision(0.05%)  VOLTAGE REFERENCE:5V; Manufacturer: BB; Name: 基准电压源; Ordering NO.: REF5050AID
footprint SO8/1.27_4.9*3.9 (SOIC, 8-Leads, Body 4.9x3.9mm, Pitch 1.27mm,)
pins: 1 DNC, 2 VIN (in), 3 TEMP, 4 GND (power), 5 TRIM, 6 VOUT (out), 7 NC, 8 DNC

## RS-2412D/H2
designator U?, comment RS-2412D
24V输入，± 12V输出，2W功率，2kV隔离; Manufacturer: RECOM; Ordering NO.: RS-2412D/H2; Name: DC/DC电源模块; Price: 110RMB
footprint SIP8-7/2.54 - A (SIP封装,8Pin)
pins: 1 -Vin, 2 +Vin, 3 CTRL, 5 NC hidden, 6 +Vout, 7 Com, 8 -Vout

## TES 1-2422
designator U?
24V输入,± 12V输出,1W,I/O isolation 1500 VDC; Manufacturer: Tracopower; Name: DC/DC电源模块; Ordering NO.: TES 1-2422
footprint SPM10-6/2.54 (SMD,Body 16.24*8.0)
pins: 1 -Vin(GND), 2 +Vin(Vcc), 4 Common, 5 -Vout, 7 +Vout

## TMR 6-2411
designator U?
24-5VDC/DC, 6W，宽电压输入，I/O isolation 1500 VDC，单路输出，最大输出电流1200mA，DC-DC 模块电源; Manufacturer: Tracopower; Name: DC/DC电源模块; Ordering NO.: TMR 6-2411
footprint SIP8-7/2.54-A (SIP封装,8Pin,21.8mm*91.mm*11.2mm)
pins: 1 -Vin(GND) (power), 2 +Vin(VCC) (in), 3 Remote On/Off, 6 +Vo (out), 7 -Vo (power)

## TPS5430DDA
designator U?, comment TPS5430
5.5-V to 36-V, 3-A STEP-DOWN SWIFT CONVERTER; Manufacturer: TI; Ordering NO.: TPS5430DDA; Name: DC/DC(非隔离型)
footprint SO8/1.27_4.9*3.9 - T (Footprint not found)
pins: 1 BOOT, 2 NC, 3 NC, 4 VSNS, 5 ENA, 6 GND, 7 VIN, 8 PH, 9 PWPD

## TPS54310PWP
designator U?
3-V TO 6-V INPUT, 3-A OUTPUT SYNCHRONOUS-BUCK PWM  SWITCHER WITH INTEGRATED FETs (SWIFT?); Manufacturer: TI; Name: PWM电源模块; Ordering NO.: TPS54310PWP
footprint TSSOP20/0.65_6.5*4.4-T (Footprint not found)
pins: 1 AGND (power), 2 VSENSE (in), 3 COMP (out), 4 PWRGD (out), 5 BOOT (in), 6 PH4 (io), 7 PH3 (io), 8 PH2 (io), 9 PH1 (io), 10 PH0 (io), 11 PGND2 (power), 12 PGND1 (power), 13 PGND0 (power), 14 VIN2 (in), 15 VIN1 (in), 16 VIN0 (in), 17 VBIAS (out), 18 SS/ENA (io), 19 SYNC (in), 20 RT (in), 21 PwrPAD

## TPS70351PWP
designator U?
Dual-Output Low-Dropout Voltage Regulators with Power  Up Sequencing for Split Voltage DSP Systems,2.7V TO 6V INPUT; Manufacturer: TI; Name: 基准电压源; Ordering NO.: TPS70351PWP
footprint TSSOP24/0.65_7.8*4.4-T (Footprint not found)
pins: 1 GND/HS (power), 2 VIN1 (in), 3 VIN1 (in), 5 ~{MR2} (in), 6 ~{MR1} (in), 7 ~{EN} (in), 8 SEQ (in), 9 GND (power), 10 VIN2 (in), 11 VIN2 (in), 12 GND/HS (power), 13 GND/HS (power), 14 VOUT2 (out), 15 VOUT2 (out), 16 VSENSE2/FB2 (in), 18 ~{RESET} (out), 19 PG1 (out), 21 VSENSE1/FB1 (in), 22 VOUT1 (out), 23 VOUT1 (out), 24 GND/HS (power), 25 HEATSINK

## TPS76912DBV
designator U?
Ultralow-Power 100-mA Low Dropout Linear Regulators, 1.2V; Manufacturer: TI; Name: LDO; Ordering NO.: TPS76912DBV
footprint SOT23-5 (SOT-23/SC-74A; 5 Leads; Body 3 x 3 mm, inc. leads (LxW max))
pins: 1 IN (in), 2 GND (power), 3 ~{EN} (in), 4 NC, 5 OUT (out)

## URB2405YMD-10WR3
designator U?
DC/DC摸块电源，24转5V，10W，超宽电压输入，隔离稳压单路; Manufacturer: 金升阳; Name: DC/DC电源模块; Price: 20; Ordering NO.: URB2405YMD-10WR3
footprint DIP6-5/5.08 (Footprint not found)
pins: 1 Vin, 2 GND, 3 +Vo, 5 0V, 6 Ctrl

## URB2405ZP-6WR2
designator U?
DC/DC厚膜IC模块24转5V,6W,金升阳; Name: DC/DC电源模块; Price: 20; Manufacturer: 金升阳; Ordering NO.: URB2405ZP-6WR2
footprint DIP23-7/2.54 (Footprint not found)
pins: 2 GND_in, 3 GND_in, 11 NC, 14 Vout, 16 GND_out, 22 Vin, 23 Vin

## V24C5T50BG
designator U?
Vicor DC-DC Converter Module, 24V Input, 5V Output, 100W; Name: DC/DC电源模块; Manufacturer: VICOR; Ordering NO.: V24C5T50BG
footprint PM7_57.9*36.8*12.7 (Footprint not found)
pins: 0 FG (power), 1 IN+ (power), 2 PC, 3 PR, 4 IN- (power), 5 OUT- (power), 6 SC, 7 OUT+ (power)

## V24C24T100BL
designator U?
Vicor DC-DC Converter Module, 24V Input Micro Family; Name: DC/DC电源模块; Manufacturer: VICOR; Ordering NO.: V24C24T100BL
footprint PM7_57.9*36.8*12.7 (57.9X36.8X12.7mm)
pins: 0 FG (power), 1 IN+ (power), 2 PC, 3 PR, 4 IN- (power), 5 OUT- (power), 6 SC, 7 OUT+ (power)

## VRA2424D-10WR2
designator U?  (value not drawn)
20W, WIDE INPUT, ISOLATED & REGULATED   DUAL OUTPUT DC-DC CONVERTER :24V-48V; Manufacturer: 金升阳; Name: DC/DC电源模块; Ordering NO.: VRA2424D-10WR2
footprint VRA2424D-10WR2
pins: 1 GND, 2 Vin, 3 +Vo, 4 NP, 5 0V, 6 Ctrl

## WRB2405S-3WR2
designator U?
24-5VDC/DC, WRA_S - 3WR2 & WRB_S - 3WR2 系列  3W，宽电压输入，隔离稳压单路输出  DC-DC 模块电源; Manufacturer: 金升阳; Name: DC/DC电源模块; Ordering NO.: WRB2405S-3WR2
footprint SIP8-7/2.54 (8Pin超小型SIP封装)
pins: 1 GND (power), 2 VIN (in), 3 CTRL, 6 +VO (out), 7 0V (power), 8 CS

## WRB2409CS-3W
designator U?
3W,宽电压输入，隔离稳压单路:9V，SIP封装DC-DC模块电源; Manufacturer: 金升阳; Name: DC/DC电源模块; Ordering NO.: WRB2409CS-3W
footprint SIP8-7/2.54 (8Pin超小型SIP封装)
pins: 1 GND (power), 2 VIN (in), 3 CTRL, 6 +VO (out), 7 0V (power), 8 CS


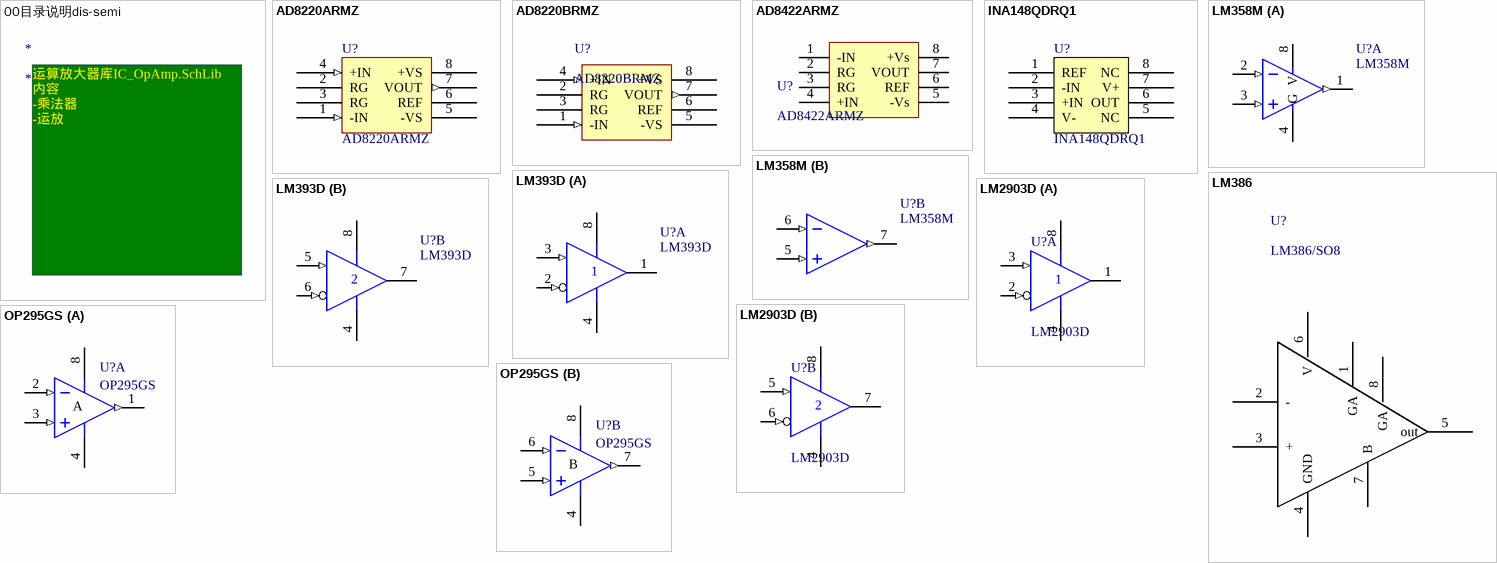
[diagram p39: symbols 00目录说明dis-semi to OP295GS]

## 00目录说明dis-semi
designator *
text: 运算放大器库IC_OpAmp.SchLib / 内容 / -乘法器 / -运放 /

## AD8220ARMZ
designator U?
JFET Input Instrumentation Amplifier with Rail-to-Rail Output; Manufacturer: ADI; Name: 运放; Ordering NO.: AD8220ARMZ
footprint MSOP8/0.65_3*3 (MSOP,8 PIN,Pitch 0.65mm,Body 3mmX3mm)
pins: 1 -IN (in), 2 RG, 3 RG, 4 +IN (in), 5 -VS (power), 6 REF, 7 VOUT (out), 8 +VS (power)

## AD8220BRMZ
designator U?
JFET Input Instrumentation Amplifer with rail to rail Output in MSOP Package; Manufacturer: ADI; Name: 运放; Ordering NO.: AD8220BRMZ
footprint MSOP8/0.65_3*3 (MSOP,8 PIN,Pitch 0.65mm,Body 3mmX3mm)
pins: 1 -IN (in), 2 RG, 3 RG, 4 +IN (in), 5 -VS (power), 6 REF, 7 VOUT (out), 8 +VS (power)

## AD8422ARMZ
designator U?
高性能、低功耗、轨到轨  精密仪表放大器; Manufacturer: ADI; Name: 精密仪表放大器; Ordering NO.: AD8422ARMZ
footprint MSOP8/0.65_3*3 (MSOP,8 PIN,Pitch 0.65mm,Body 3mmX3mm)
pins: 1 -IN, 2 RG, 3 RG, 4 +IN, 5 -Vs, 6 REF, 7 VOUT, 8 +Vs

## INA148QDRQ1
designator U?
±200-V COMMON-MODE VOLTAGE DIFFERENCE AMPLIFIER; Manufacturer: TI; Name: 运放; Ordering NO.: INA148QDRQ1
footprint SO8/1.27_4.9*3.9 (SOIC, 8-Leads, Body 4.9x3.9mm, Pitch 1.27mm,)
pins: 1 REF, 2 -IN, 3 +IN, 4 V-, 5 NC, 6 OUT, 7 V+, 8 NC

## LM358M
designator U?
低功耗双运放, SO8封装; Manufacturer: TI; Name: 运放; Ordering NO.: LM358M
footprint SO8/1.27_4.9*3.9 (SOIC, 8-Leads, Body 4.9x3.9mm, Pitch 1.27mm,)
part A pins: 1 OUTA (out), 2 INA- (in), 3 INA+ (in), 4 G (power), 8 V (power)
part B pins: 5 INB+ (in), 6 INB- (in), 7 OUTB (out)

## LM386
designator U?, comment LM386/SO8
小功率音频功放mono; Manufacturer: National Semiconductor; Name: 运放; Ordering NO.: LM386; Price: 1.5
footprint SO8/1.27_4.9*3.9 (SOIC, 8-Leads, Body 4.9x3.9mm, Pitch 1.27mm,)
pins: 1 GA, 2 -, 3 +, 4 GND, 5 out, 6 V, 7 B, 8 GA

## LM393D
designator U?
Dual Differential Comparator; Manufacturer: TI; Name: 比较器; Ordering NO.: LM393D
footprint SO8/1.27_4.9*3.9 (SOIC, 8-Leads, Body 4.9x3.9mm, Pitch 1.27mm,)
3D model 751-02 (8-Pin Small Outline Integrated Circuit 1.27 mm Pitch)
part A pins: 1 OUT (oc), 2 IN- (in), 3 IN+ (in), 4 GND (power), 8 VCC (power)
part B pins: 4 GND (power), 5 IN+ (in), 6 IN- (in), 7 OUT (oc), 8 VCC (power)

## LM2903D
designator U?
Dual Differential Comparator; Manufacturer: TI; Name: 比较器; Ordering NO.: LM2903D
footprint SO8/1.27_4.9*3.9 (SOIC, 8-Leads, Body 4.9x3.9mm, Pitch 1.27mm,)
part A pins: 1 OUT (oc), 2 IN- (in), 3 IN+ (in), 4 GND (power), 8 VCC (power)
part B pins: 4 GND (power), 5 IN+ (in), 6 IN- (in), 7 OUT (oc), 8 VCC (power)

## OP295GS
designator U?
Fast Settling Dual Operational Amplifier; Manufacturer: ADI; Name: 运放; Ordering NO.: OP295GS
simulation model OP295G (SUBCKT)
footprint SO8/1.27_4.9*3.9 (SOIC, 8-Leads, Body 4.9x3.9mm, Pitch 1.27mm,)
part A pins: 1 OUT (out), 2 IN- (in), 3 IN+ (in), 4 V- (power), 8 V+ (power)
part B pins: 4 V- (power), 5 IN+ (in), 6 IN- (in), 7 OUT (out), 8 V+ (power)
part A text: A
part B text: B